# Altium footprint library connectors.PCBLIB: 188 footprints (part 4 of 12)
Each footprint in its own frame and in the unit in brackets; x right, y up, seen from the top. Pads: shape width x height; smd on the part's side, far side on the other; paste and mask are expansions set on the pad; w line width, h text height; cw(c..) or ccw(c..) is an arc to the next point about the centre after c.
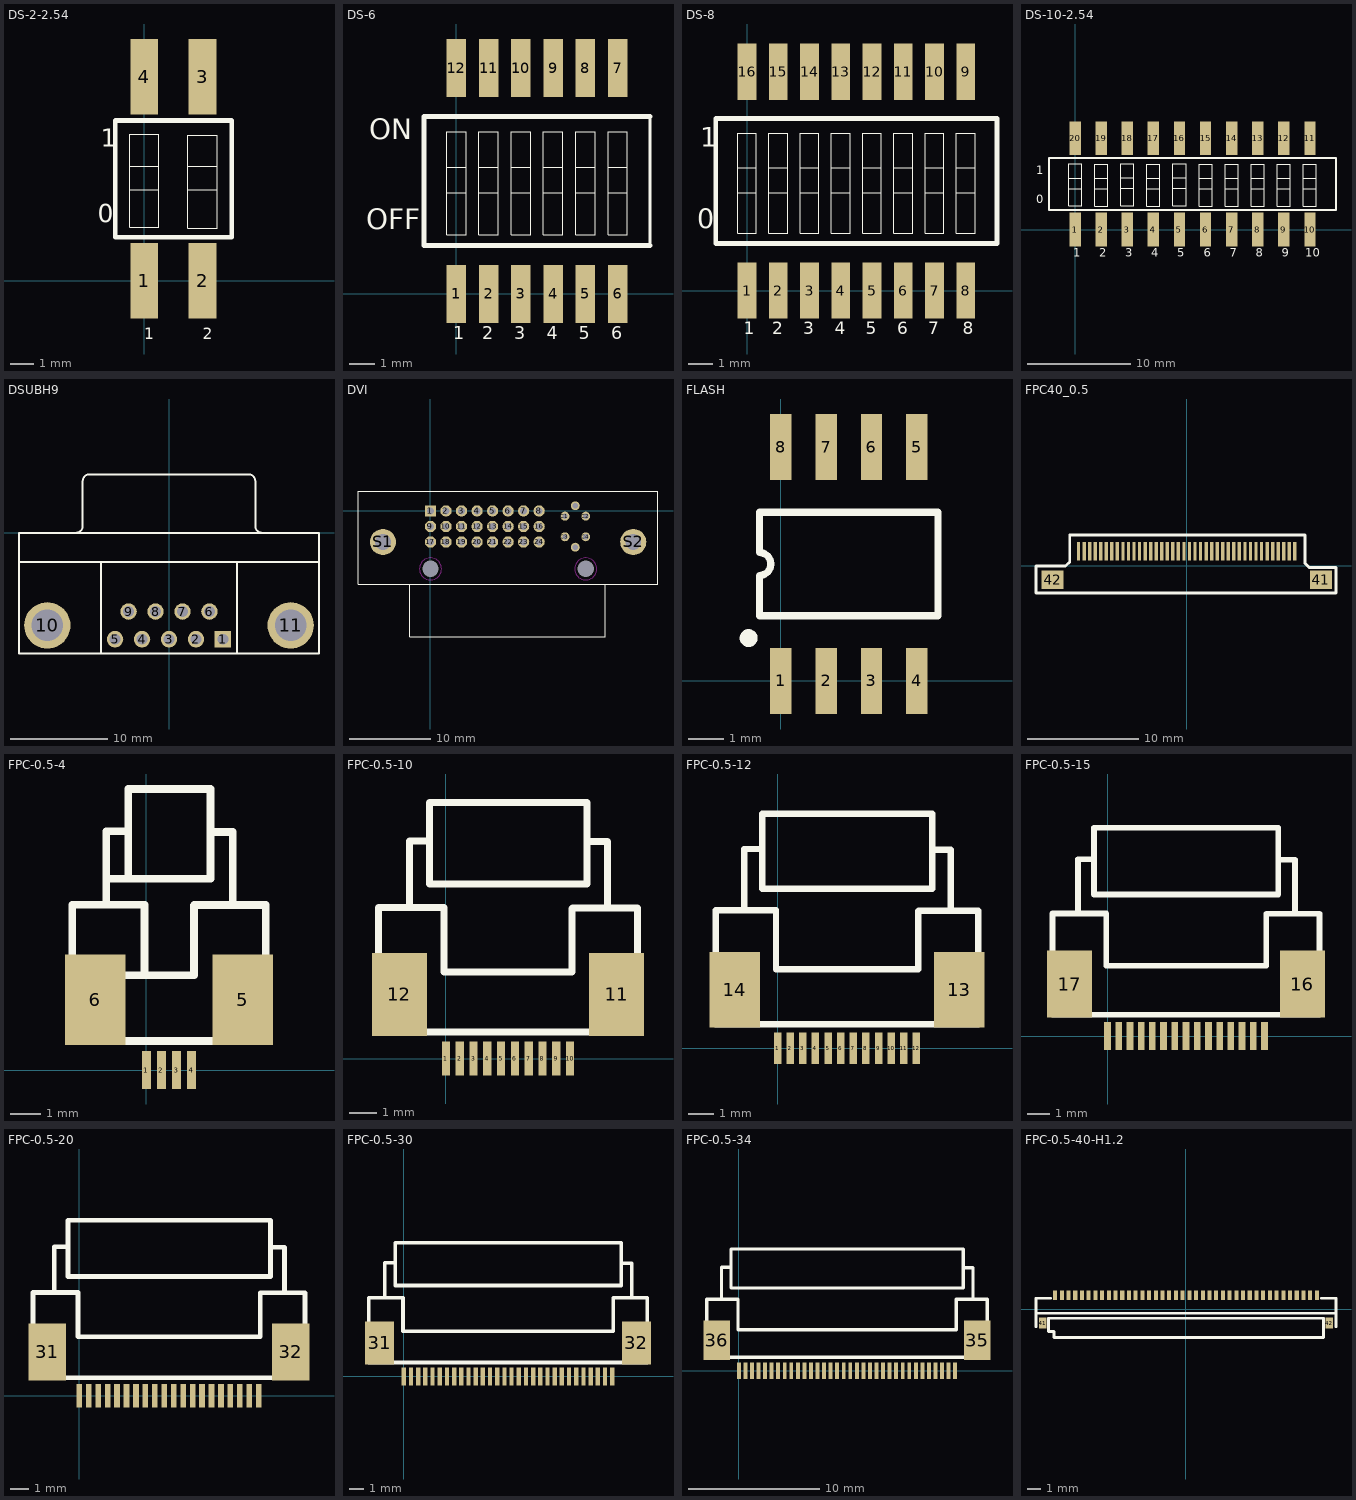
[diagram p3: the footprints below, top view; thin cyan lines are the x and y axes]

## DS-2-2.54 [mm]
pads (4):
  rect 1.2x3.3 smd: 1(0,0) 2(2.54,0) 3(2.54,8.89) 4(0,8.89)
Top Overlay:
  lines w0.025: -0.635,3.977 0.635,3.977 ; -0.635,4.993 0.635,4.993 ; 1.905,3.977 3.175,3.977 ; 1.905,4.993 3.175,4.993 ; -0.635,2.326 -0.635,3.342 -0.635,5.374 -0.635,6.39 0.635,6.39 0.635,2.326 -0.635,2.326 ; 1.905,2.286 3.175,2.286 3.175,6.35 1.905,6.35 1.905,2.286
  lines w0.2: -1.27,1.905 -1.27,6.985 3.81,6.985 3.81,1.905 -1.27,1.905
  text "2" at 2.54,-2.54 h0.5
  text "1" at 0,-2.54 h0.5
  text "1" at -1.905,5.842 h0.8
  text "0" at -2.032,2.54 h0.8

## DS-6 [mil]
pads (12):
  rect 30x90 smd: 1(0,0) 2(50,0) 3(100,0) 4(150,0) 5(200,0) 6(250,0) 7(250,350) 8(200,350) 9(150,350) 10(100,350) 11(50,350) 12(0,350)
Top Overlay:
  lines w0.98: -15,156.57 15,156.57 ; -15,196.57 15,196.57 ; 35,156.57 65,156.57 ; 35,196.57 65,196.57 ; 85,156.57 115,156.57 ; 85,196.57 115,196.57 ; 135,156.57 165,156.57 ; 135,196.57 165,196.57 ; 185,156.57 215,156.57 ; 185,196.57 215,196.57 ; 235,156.57 265,156.57 ; 235,196.57 265,196.57 ; -15,91.57 -15,131.57 -15,211.57 -15,251.57 15,251.57 15,91.57 -15,91.57 ; 35,91.57 65,91.57 65,251.57 35,251.57 35,91.57 ; 85,91.57 115,91.57 115,251.57 85,251.57 85,91.57 ; 135,91.57 165,91.57 165,251.57 135,251.57 135,91.57 ; 185,91.57 215,91.57 215,251.57 185,251.57 185,91.57 ; 235,91.57 265,91.57 265,251.57 235,251.57 235,91.57
  lines w5: 300,75 300,275
  lines w7.87: 300,75 -50,75 -50,275 300,275
  text "6" at 240,-70 h19.68
  text "5" at 190,-70 h19.68
  text "4" at 140,-70 h19.68
  text "3" at 90,-70 h19.68
  text "2" at 40,-70 h19.68
  text "1" at -5,-70 h19.68
  text "ON" at -135,240 h31.5
  text "OFF" at -140,100 h31.5

## DS-8 [mil]
pads (16):
  rect 30x90 smd: 1(0,0) 2(50,0) 3(100,0) 4(150,0) 5(200,0) 6(250,0) 7(300,0) 8(350,0) 9(350,350) 10(300,350) 11(250,350) 12(200,350) 13(150,350) 14(100,350) 15(50,350) 16(0,350)
Top Overlay:
  lines w0.98: -15,156.57 15,156.57 ; -15,196.57 15,196.57 ; 35,156.57 65,156.57 ; 35,196.57 65,196.57 ; 85,156.57 115,156.57 ; 85,196.57 115,196.57 ; 135,156.57 165,156.57 ; 135,196.57 165,196.57 ; 185,156.57 215,156.57 ; 185,196.57 215,196.57 ; 235,156.57 265,156.57 ; 235,196.57 265,196.57 ; 285,156.57 315,156.57 ; 285,196.57 315,196.57 ; 335,156.57 365,156.57 ; 335,196.57 365,196.57 ; -15,91.57 -15,131.57 -15,211.57 -15,251.57 15,251.57 15,91.57 -15,91.57 ; 35,91.57 65,91.57 65,251.57 35,251.57 35,91.57 ; 85,91.57 115,91.57 115,251.57 85,251.57 85,91.57 ; 135,91.57 165,91.57 165,251.57 135,251.57 135,91.57 ; 185,91.57 215,91.57 215,251.57 185,251.57 185,91.57 ; 235,91.57 265,91.57 265,251.57 235,251.57 235,91.57 ; 285,91.57 285,251.57 315,251.57 315,91.57 285,91.57 ; 335,91.57 335,251.57 365,251.57 365,91.57 335,91.57
  lines w7.87: -50,75 -50,275 400,275 400,75 -50,75
  text "6" at 240,-70 h19.68
  text "5" at 190,-70 h19.68
  text "4" at 140,-70 h19.68
  text "3" at 90,-70 h19.68
  text "2" at 40,-70 h19.68
  text "1" at -5,-70 h19.68
  text "1" at -75,230 h31.5
  text "0" at -80,100 h31.5
  text "7" at 290,-70 h19.68
  text "8" at 345,-70 h19.68

## DS-10-2.54 [mm]
pads (20):
  rect 1.1x3.3 smd: 1(0,0) 2(2.54,0) 3(5.08,0) 4(7.62,0) 5(10.16,0) 6(12.7,0) 7(15.24,0) 8(17.78,0) 9(20.32,0) 10(22.86,0) 11(22.86,8.89) 12(20.32,8.89) 13(17.78,8.89) 14(15.24,8.89) 15(12.7,8.89) 16(10.16,8.89) 17(7.62,8.89) 18(5.08,8.89) 19(2.54,8.89) 20(0,8.89)
Top Overlay:
  lines w0.025: -0.635,3.977 0.635,3.977 ; -0.635,4.993 0.635,4.993 ; 1.905,3.977 3.175,3.977 ; 1.905,4.993 3.175,4.993 ; 4.445,4.017 5.715,4.017 ; 4.445,5.033 5.715,5.033 ; 6.985,3.977 8.255,3.977 ; 6.985,4.993 8.255,4.993 ; 9.525,4.017 10.795,4.017 ; 9.525,5.033 10.795,5.033 ; 12.065,3.977 13.335,3.977 ; 12.065,4.993 13.335,4.993 ; 14.605,3.977 15.875,3.977 ; 14.605,4.993 15.875,4.993 ; 17.145,3.977 18.415,3.977 ; 17.145,4.993 18.415,4.993 ; 19.685,3.977 20.955,3.977 ; 19.685,4.993 20.955,4.993 ; 22.225,3.977 23.495,3.977 ; 22.225,4.993 23.495,4.993 ; -0.635,2.326 0.635,2.326 0.635,6.39 -0.635,6.39 -0.635,5.374 -0.635,3.342 -0.635,2.326 ; 1.905,2.286 1.905,6.35 3.175,6.35 3.175,2.286 1.905,2.286 ; 4.445,2.326 5.715,2.326 5.715,6.39 4.445,6.39 4.445,2.326 ; 6.985,2.286 8.255,2.286 8.255,6.35 6.985,6.35 6.985,2.286 ; 9.525,2.326 10.795,2.326 10.795,6.39 9.525,6.39 9.525,2.326 ; 12.065,2.286 13.335,2.286 13.335,6.35 12.065,6.35 12.065,2.286 ; 14.605,2.286 15.875,2.286 15.875,6.35 14.605,6.35 14.605,2.286 ; 17.145,2.286 18.415,2.286 18.415,6.35 17.145,6.35 17.145,2.286 ; 19.685,2.286 20.955,2.286 20.955,6.35 19.685,6.35 19.685,2.286 ; 22.225,2.286 23.495,2.286 23.495,6.35 22.225,6.35 22.225,2.286
  lines w0.2: -2.54,1.905 25.4,1.905 25.4,6.985 -2.54,6.985 -2.54,1.905
  text "10" at 22.4,-2.64 h0.8
  text "9" at 20.12,-2.64 h0.8
  text "8" at 17.58,-2.64 h0.8
  text "7" at 15.04,-2.64 h0.8
  text "6" at 12.5,-2.64 h0.8
  text "5" at 9.96,-2.64 h0.8
  text "4" at 7.42,-2.64 h0.8
  text "3" at 4.88,-2.64 h0.8
  text "0" at -3.81,2.54 h0.8
  text "1" at -3.81,5.374 h0.8
  text "1" at -0.2,-2.64 h0.8
  text "2" at 2.34,-2.64 h0.8

## DSUBH9 [mm] "Connector; D Subminiature; 9 Position; Right Angle; Pitch 1.385 mm"
height 12.75
pads (11):
  rect 1.69x1.69 hole 1.09: 1(5.54,-10.92)
  round 1.69 hole 1.09: 2(2.77,-10.92) 3(0,-10.92) 4(-2.77,-10.92) 5(-5.54,-10.92) 6(4.155,-8.08) 7(1.385,-8.08) 8(-1.385,-8.08) 9(-4.155,-8.08)
  round 4.76 hole 3.26: 10(-12.495,-9.5) 11(12.495,-9.5)
Top Overlay:
  lines w0.2: -15.4,-3 15.4,-3 ; -9.56,0.005 ccw(c-9.56,0.7) -8.865,0.7 -8.865,5.3 ; -8.86,5.305 cw(c-8.165,5.305) -8.165,6 8.165,6 cw(c8.165,5.305) 8.86,5.305 ; -7,-12.4 -7,-3 ; 7,-12.4 7,-3 ; 8.865,5.3 8.865,0.7 ccw(c9.56,0.7) 9.56,0.005 ; -15.4,-12.4 -15.4,0 15.4,0 15.4,-12.4 -15.4,-12.4

## DVI [mil]
pads (34):
  rect 55x55 hole 34: 1(0,0)
  round 55 hole 34: 2(75,0) 3(150,0) 4(225,0) 5(300,0) 6(375,0) 7(450,0) 8(525,0) 9(0,-75) 10(75,-75) 11(150,-75) 12(225,-75) 13(300,-75) 14(375,-75) 15(450,-75) 16(525,-75) 17(0,-150) 18(75,-150) 19(150,-150) 20(225,-150) 21(300,-150) 22(375,-150) 23(450,-150) 24(525,-150)
  round 10 hole 78.74: " "(0,-279.92) " "(750,-279.92)
  round 43 hole 26: C1(650,-25) C2(750,-25) C3(650,-125) C4(750,-125) C5_1(700,25) C5_2(700,-175)
  round 126 hole 76: S1(-229.92,-150) S2(979.92,-150)
Top Overlay:
  lines w5: -100.3,-353.84 -100.3,-608.84 844.7,-608.84 844.7,-353.84 ; -350.3,-353.84 1099.7,-353.84 1099.7,96.16 -350.3,96.16 -350.3,-353.84
Multi-Layer keep-out:
  circle w1: c0,-279.92 r53.5
  circle w1: c750,-279.92 r53.5

## FLASH [mm] "Small Outline; 8 Leads; Body Width 3.9 mm; Pitch 1.27 mm"
height 1.75
pads (8):
  rect 0.6x1.85 smd: 1(0,0) 2(1.27,0) 3(2.54,0) 4(3.81,0) 5(3.81,6.55) 6(2.54,6.55) 7(1.27,6.55) 8(0,6.55)
Top Overlay:
  circle w0.25: c-0.9,1.2 r0.125
  lines w0.2: -0.595,1.825 -0.595,2.957 ccw(c-0.595,3.275) -0.595,3.592 -0.595,4.725 4.405,4.725 4.405,1.825 -0.595,1.825

## FPC40_0.5 [mm]
pads (42):
  rect 0.3x1.7 smd: 1(-9.75,1.289) 2(-9.25,1.289) 3(-8.75,1.289) 4(-8.25,1.289) 5(-7.75,1.289) 6(-7.25,1.289) 7(-6.75,1.289) 8(-6.25,1.289) 9(-5.75,1.289) 10(-5.25,1.289) 11(-4.75,1.289) 12(-4.25,1.289) 13(-3.75,1.289) 14(-3.25,1.289) 15(-2.75,1.289) 16(-2.25,1.289) 17(-1.75,1.289) 18(-1.25,1.289) 19(-0.75,1.289) 20(-0.25,1.289) 21(0.25,1.289) 22(0.75,1.289) 23(1.25,1.289) 24(1.75,1.289) 25(2.25,1.289) 26(2.75,1.289) 27(3.25,1.289) 28(3.75,1.289) 29(4.25,1.289) 30(4.75,1.289) 31(5.25,1.289) 32(5.75,1.289) 33(6.25,1.289) 34(6.75,1.289) 35(7.25,1.289) 36(7.75,1.289) 37(8.25,1.289) 38(8.75,1.289) 39(9.25,1.289) 40(9.75,1.289)
  rect 2x1.7 smd: 41(12.1,-1.289) 42(-12.1,-1.289)
Top Overlay:
  lines w0.254: -13.589,-2.468 -13.589,-0.055 -10.922,-0.055 -10.541,0.326 -10.541,2.231 -10.541,2.739 10.668,2.739 10.668,2.104 10.668,0.199 11.049,-0.182 13.462,-0.182 13.462,-2.468 -13.589,-2.468

## FPC-0.5-4 [mm]
pads (6):
  rect 0.3x1.25 smd: 1(0,0) 2(0.5,0) 3(1,0) 4(1.5,0)
  rect 2x3 smd: 5(3.19,2.325) 6(-1.69,2.325)
Top Overlay:
  lines w0.254: -2.45,3.135 1.576,3.135 1.576,5.142 1.576,5.442 1.589,5.456 3.95,5.456 3.95,4.263 3.95,0.962 -2.45,0.962 -2.45,5.162 -2.45,5.47 -0.062,5.47 -0.062,3.135 ; -1.321,5.47 -1.321,7.897 -0.625,7.897 -0.6,7.922 ; -1.321,6.322 2.121,6.322 2.121,9.294 -0.6,9.294 -0.6,6.322 ; 2.121,7.846 2.146,7.871 2.857,7.871 2.857,5.456

## FPC-0.5-10 [mm]
pads (12):
  rect 0.3x1.25 smd: 1(0,0) 2(0.5,0) 3(1,0) 4(1.5,0) 5(2,0) 6(2.5,0) 7(3,0) 8(3.5,0) 9(4,0) 10(4.5,0)
  rect 2x3 smd: 11(6.19,2.325) 12(-1.69,2.325)
Top Overlay:
  lines w0.254: -1.321,5.47 -1.321,7.897 -0.625,7.897 -0.6,7.922 ; 5.121,7.846 5.146,7.871 5.857,7.871 5.857,5.456 ; -2.45,0.962 6.95,0.962 6.95,4.263 6.95,5.456 4.589,5.456 4.576,5.442 4.576,5.142 4.576,3.135 -0.062,3.135 -0.062,5.47 -2.45,5.47 -2.45,5.162 -2.45,0.962 ; -0.6,6.322 5.121,6.322 5.121,9.294 -0.6,9.294 -0.6,6.322

## FPC-0.5-12 [mm]
pads (14):
  rect 0.3x1.25 smd: 1(0,0) 2(0.5,0) 3(1,0) 4(1.5,0) 5(2,0) 6(2.5,0) 7(3,0) 8(3.5,0) 9(4,0) 10(4.5,0) 11(5,0) 12(5.5,0)
  rect 2x3 smd: 13(7.19,2.325) 14(-1.69,2.325)
Top Overlay:
  lines w0.254: -1.321,5.47 -1.321,7.897 -0.625,7.897 -0.6,7.922 ; 6.121,7.846 6.146,7.871 6.857,7.871 6.857,5.456 ; -2.45,0.962 -2.45,5.162 -2.45,5.47 -0.062,5.47 -0.062,3.135 5.576,3.135 5.576,5.142 5.576,5.442 5.589,5.456 7.95,5.456 7.95,4.263 7.95,0.962 -2.45,0.962 ; -0.6,6.322 -0.6,9.294 6.121,9.294 6.121,6.322 -0.6,6.322

## FPC-0.5-15 [mm]
pads (17):
  rect 0.3x1.25 smd: 1(0,0) 2(0.5,0) 3(1,0) 4(1.5,0) 5(2,0) 6(2.5,0) 7(3,0) 8(3.5,0) 9(4,0) 10(4.5,0) 11(5,0) 12(5.5,0) 13(6,0) 14(6.5,0) 15(7,0)
  rect 2x3 smd: 16(8.69,2.325) 17(-1.69,2.325)
Top Overlay:
  lines w0.254: -1.321,5.47 -1.321,7.897 -0.625,7.897 -0.6,7.922 ; 7.621,7.846 7.646,7.871 8.357,7.871 8.357,5.456 ; -2.45,0.962 -2.45,5.162 -2.45,5.47 -0.062,5.47 -0.062,3.135 7.076,3.135 7.076,5.142 7.076,5.442 7.089,5.456 9.45,5.456 9.45,4.263 9.45,0.962 -2.45,0.962 ; -0.6,6.322 -0.6,9.294 7.621,9.294 7.621,6.322 -0.6,6.322

## FPC-0.5-20 [mm]
pads (22):
  rect 0.3x1.25 smd: 1(0,0) 2(0.5,0) 3(1,0) 4(1.5,0) 5(2,0) 6(2.5,0) 7(3,0) 8(3.5,0) 9(4,0) 10(4.5,0) 11(5,0) 12(5.5,0) 13(6,0) 14(6.5,0) 15(7,0) 16(7.5,0) 17(8,0) 18(8.5,0) 19(9,0) 20(9.5,0)
  rect 2x3 smd: 31(-1.69,2.325) 32(11.19,2.325)
Top Overlay:
  lines w0.254: -1.321,5.47 -1.321,7.897 -0.625,7.897 -0.6,7.922 ; 9.5,3.135 -0.062,3.135 -0.062,5.47 -2.45,5.47 -2.45,5.162 -2.45,0.962 11.9,0.962 ; 9.576,3.135 9.576,5.142 9.576,5.442 9.589,5.456 11.95,5.456 11.95,4.263 11.95,0.962 ; 10.1,6.322 -0.6,6.322 -0.6,9.294 10.1,9.294 ; 10.121,6.322 10.121,9.294 ; 10.121,7.846 10.146,7.871 10.857,7.871 10.857,5.456

## FPC-0.5-30 [mm]
pads (32):
  rect 0.3x1.25 smd: 1(0,0) 2(0.5,0) 3(1,0) 4(1.5,0) 5(2,0) 6(2.5,0) 7(3,0) 8(3.5,0) 9(4,0) 10(4.5,0) 11(5,0) 12(5.5,0) 13(6,0) 14(6.5,0) 15(7,0) 16(7.5,0) 17(8,0) 18(8.5,0) 19(9,0) 20(9.5,0) 21(10,0) 22(10.5,0) 23(11,0) 24(11.5,0) 25(12,0) 26(12.5,0) 27(13,0) 28(13.5,0) 29(14,0) 30(14.5,0)
  rect 2x3 smd: 31(-1.69,2.325) 32(16.19,2.325)
Top Overlay:
  lines w0.254: -1.321,5.47 -1.321,7.897 -0.625,7.897 -0.6,7.922 ; 15.121,7.846 15.146,7.871 15.857,7.871 15.857,5.456 ; -2.45,0.962 16.95,0.962 16.95,4.263 16.95,5.456 14.589,5.456 14.576,5.442 14.576,5.142 14.576,3.135 -0.062,3.135 -0.062,5.47 -2.45,5.47 -2.45,5.162 -2.45,0.962 ; -0.6,6.322 15.121,6.322 15.121,9.294 -0.6,9.294 -0.6,6.322

## FPC-0.5-34 [mm]
pads (36):
  rect 0.3x1.25 smd: 1(0,0) 2(0.5,0) 3(1,0) 4(1.5,0) 5(2,0) 6(2.5,0) 7(3,0) 8(3.5,0) 9(4,0) 10(4.5,0) 11(5,0) 12(5.5,0) 13(6,0) 14(6.5,0) 15(7,0) 16(7.5,0) 17(8,0) 18(8.5,0) 19(9,0) 20(9.5,0) 21(10,0) 22(10.5,0) 23(11,0) 24(11.5,0) 25(12,0) 26(12.5,0) 27(13,0) 28(13.5,0) 29(14,0) 30(14.5,0) 31(15,0) 32(15.5,0) 33(16,0) 34(16.5,0)
  rect 2x3 smd: 35(18.19,2.325) 36(-1.69,2.325)
Top Overlay:
  lines w0.254: -1.321,5.47 -1.321,7.897 -0.625,7.897 -0.6,7.922 ; 17.121,7.846 17.146,7.871 17.857,7.871 17.857,5.456 ; -2.45,1.075 -2.413,1.038 18.95,1.038 18.95,4.263 18.95,5.456 16.589,5.456 16.576,5.442 16.576,5.142 16.576,3.135 -0.062,3.135 -0.062,5.47 -2.45,5.47 -2.45,5.162 -2.45,1.075 ; -0.6,6.322 17.121,6.322 17.121,9.294 -0.6,9.294 -0.6,6.322

## FPC-0.5-40-H1.2 [mm]
pads (42):
  rect 0.3x0.7 smd: 1(-9.75,1.038) 2(-9.25,1.038) 3(-8.75,1.038) 4(-8.25,1.038) 5(-7.75,1.038) 6(-7.25,1.038) 7(-6.75,1.038) 8(-6.25,1.038) 9(-5.75,1.038) 10(-5.25,1.038) 11(-4.75,1.038) 12(-4.25,1.038) 13(-3.75,1.038) 14(-3.25,1.038) 15(-2.75,1.038) 16(-2.25,1.038) 17(-1.75,1.038) 18(-1.25,1.038) 19(-0.75,1.038) 20(-0.25,1.038) 21(0.25,1.038) 22(0.75,1.038) 23(1.25,1.038) 24(1.75,1.038) 25(2.25,1.038) 26(2.75,1.038) 27(3.25,1.038) 28(3.75,1.038) 29(4.25,1.038) 30(4.75,1.038) 31(5.25,1.038) 32(5.75,1.038) 33(6.25,1.038) 34(6.75,1.038) 35(7.25,1.038) 36(7.75,1.038) 37(8.25,1.038) 38(8.75,1.038) 39(9.25,1.038) 40(9.75,1.038)
  rect 0.55x0.8 smd mask+0.09: 41(-10.675,-1.037) 42(10.675,-1.038)
Top Overlay:
  lines w0.2: -11.175,-1.312 -11.175,0.813 -10.075,0.813 ; -11.175,-0.312 11.175,-0.312 ; 10.075,0.813 11.175,0.813 11.175,-1.312 ; -10.25,-1.662 -9.839,-1.662 -9.839,-2.112 10.25,-2.112 10.25,-0.687 -10.25,-0.687 -10.25,-1.662